# Altium footprint library surface.PcbLib: 97 footprints (part 5 of 7)
Each footprint in its own frame and in the unit in brackets; x right, y up, seen from the top. Pads: shape width x height; smd on the part's side, far side on the other; paste and mask are expansions set on the pad; w line width, h text height; cw(c..) or ccw(c..) is an arc to the next point about the centre after c.
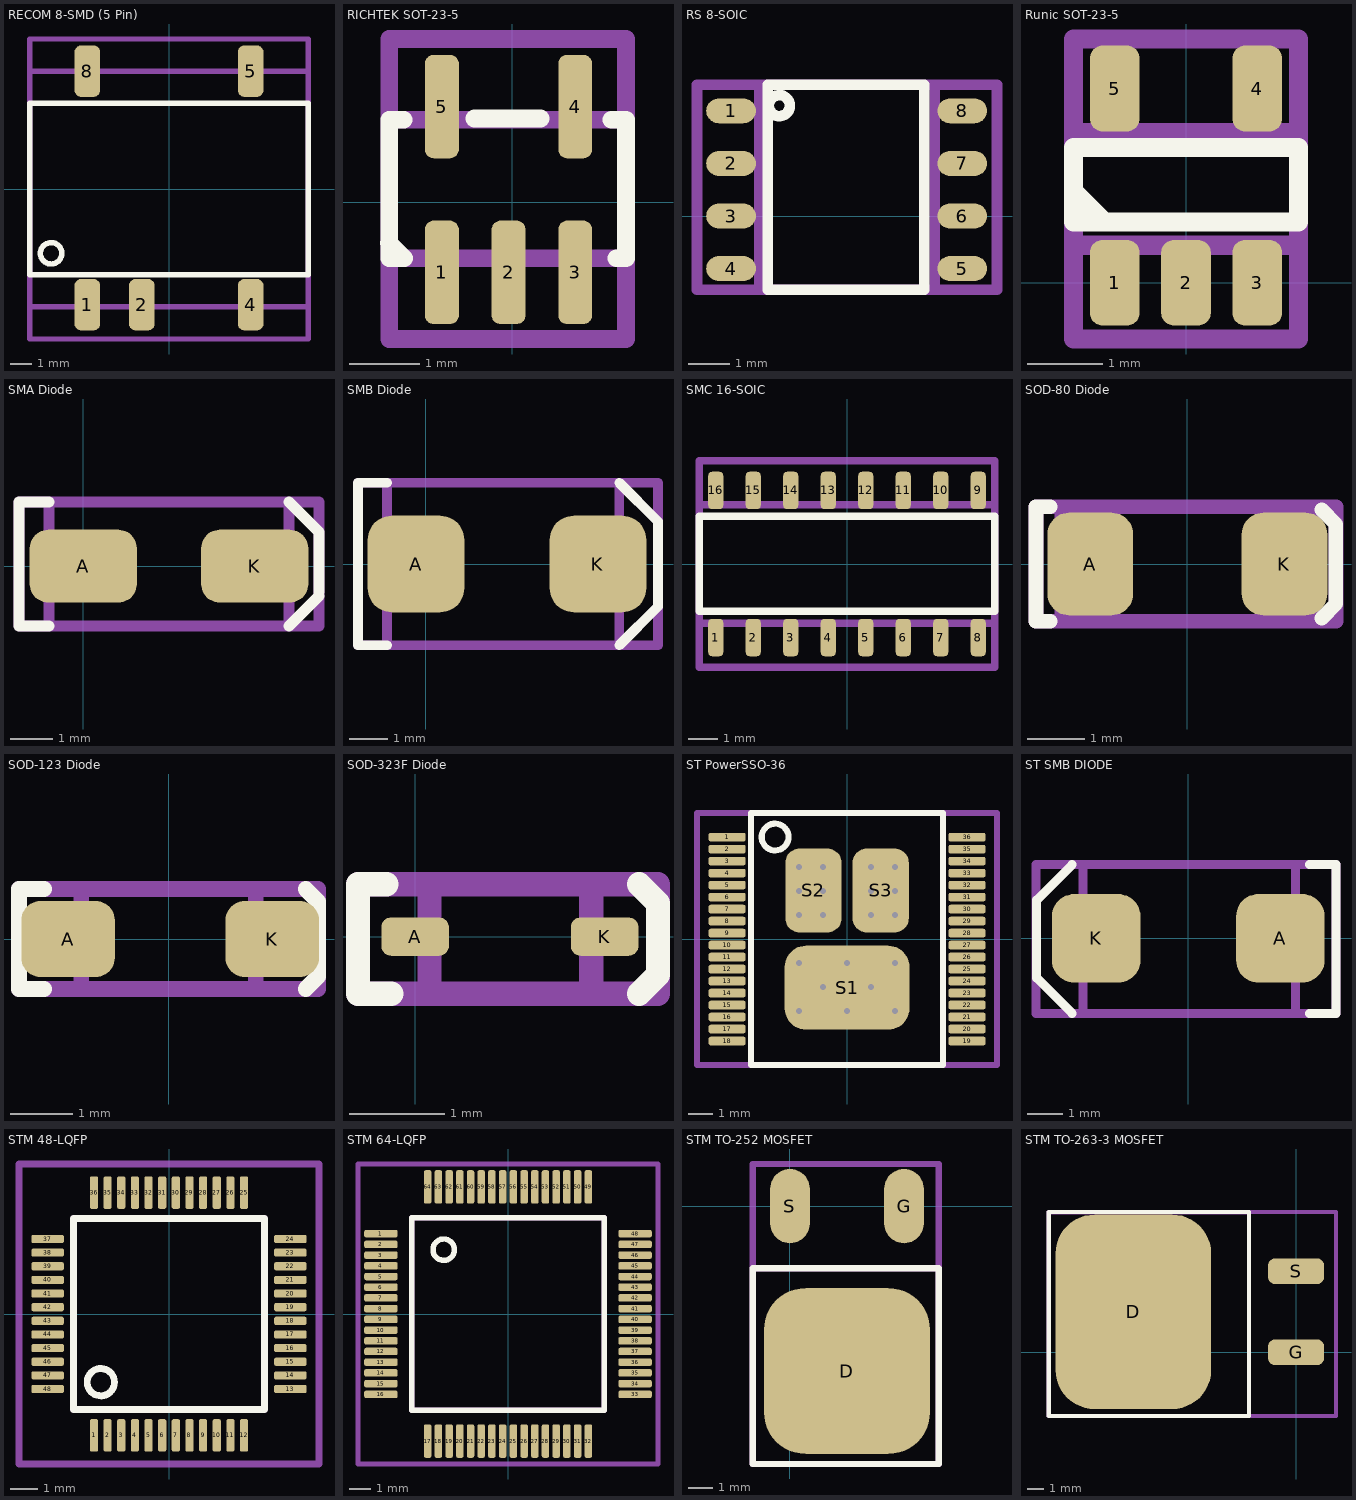
[diagram p4: the footprints below, top view; thin cyan lines are the x and y axes]

## RECOM 8-SMD (5 Pin) [mm]
pads (5):
  rrect50% 1.2x2.4 smd: 1(-3.81,-5.4) 2(-1.27,-5.4) 4(3.81,-5.4) 5(3.81,5.5) 8(-3.81,5.5)
Top Overlay:
  circle w0.254: c-5.5,-3 r0.5
  lines w0.254: -6.5,-4 6.5,-4 6.5,4 -6.5,4 -6.5,-4
Mechanical 13:
  lines w0.254: -6.5,-5.5 6.5,-5.5 6.5,5.5 -6.5,5.5 -6.5,-5.5
Mechanical 15:
  lines w0.254: -6.5,-7 -6.5,7 6.5,7 6.5,-7 -6.5,-7
3D body "R2S-2405-H--3DModel-STEP-1.STEP": height 9.2, standoff 0.2, extent -6.375,-5.55 6.375,5.55

## RICHTEK SOT-23-5 [mil]
pads (5):
  rrect50% 19x58 smd: 1(-39.37,-39.37) 2(-1.97,-39.37) 3(35.43,-39.37) 4(35.43,53.63) 5(-39.37,53.63)
Top Overlay:
  lines w10: -69,-23 -60.5,-31.5 ; -60.74,46.26 -68.9,46.26 -68.9,-31.5 -60.5,-31.5 ; -21,47 16,47 ; 55.74,46.26 63.98,46.26 63.98,-31.5 58.5,-31.5 ; -60.5,-31.5 -60.5,-31.5
Mechanical 13:
  lines w10: -68.9,-76.77 63.98,-76.77 63.98,91.54 -68.9,91.54 -68.9,-76.77
Mechanical 15:
  lines w10: -68.9,-31.5 -68.9,46.26 63.98,46.26 63.98,-31.5 -68.9,-31.5
3D body "DBV5.step": height 57.09, standoff 0, extent -61.97,-51.13 58.03,66.9

## RS 8-SOIC [mm]
pads (8):
  oval 1.2x0.6 smd: 1(-9.677,2.54) 2(-9.677,1.27) 3(-9.677,0) 4(-9.677,-1.27) 5(-4.089,-1.27) 6(-4.089,0) 7(-4.089,1.27) 8(-4.089,2.54)
Top Overlay:
  circle w0.254: c-8.509,2.667 r0.254
  lines w0.254: -8.788,-1.778 -5.004,-1.778 -5.004,3.175 -8.788,3.175 -8.788,-1.778
Mechanical 13:
  lines w0.254: -9,-1.778 -4.75,-1.778 -4.75,3.175 -8.255,3.175 -9,3.175 -9,-1.778
Mechanical 15:
  lines w0.254: -10.5,-1.778 -3.25,-1.778 -3.25,3.175 -10.5,3.175 -10.5,-1.778
3D body "D8.step": height 1.76, standoff 0, extent -9.957,-1.867 -3.759,3.137

## Runic SOT-23-5 [mil]
pads (5):
  rrect50% 26x45 smd: 1(-37.4,0) 2(0,0) 3(37.4,0) 4(37.4,101.97) 5(-37.4,101.97)
Top Overlay:
  lines w10: -59.06,49.21 -59.06,48.06 -44,33 ; -59.06,32 59.06,32 59.06,71 -59.06,71 -59.06,32
Mechanical 13:
  lines w10: -59.06,19.68 -59.06,78.74 59.06,78.74 59.06,19.68 -59.06,19.68
Mechanical 15:
  lines w10: -59.06,-29.53 -59.06,127.95 59.06,127.95 59.06,-29.53 -59.06,-29.53
3D body "DBV5.step": height 57.09, standoff 0, extent -60,-8.02 60,110.01

## SMA Diode [mm]
pads (2):
  rrect50% 2.5x1.7 smd: A(0,0) K(4,0)
Top Overlay:
  lines w0.254: -0.8,-1.4 -1.5,-1.4 -1.5,1.5 -0.8,1.5 ; 4.8,-1.4 5.5,-0.7 ; 4.8,1.5 5.5,0.8 5.5,-0.6
Mechanical 13:
  lines w0.254: -0.8,-1.4 -0.8,1.5 4.8,1.5 4.8,-1.4 -0.8,-1.4
Mechanical 15:
  lines w0.254: -1.5,-1.4 5.5,-1.4 5.5,1.5 -1.5,1.5 -1.5,-1.4
3D body "SMA.step": height 2.35, standoff 0, extent -0.795,-1.46 4.795,1.46

## SMB Diode [mm]
pads (2):
  rrect50% 2.5x2.5 smd: A(-0.25,0) K(4.45,0)
Top Overlay:
  lines w0.254: -1,-2.1 -1.75,-2.1 -1.75,2.1 -1,2.1 ; 5,-2.1 6,-1.1 6,1.1 5,2.1 ; 6,-1 6,0.7
Mechanical 13:
  lines w0.254: -1,-2.1 -1,2.1 5,2.1 5,-2.1 -1,-2.1
Mechanical 15:
  lines w0.254: -1.75,-2.1 -1.75,2.1 6,2.1 6,-2.1 -1.75,-2.1
3D body "SMB.STEP": height 2.5, standoff 0, extent -0.695,-1.97 4.895,1.97

## SMC 16-SOIC [mm]
pads (16):
  rrect50% 0.51x1.27 smd: 1(-4.445,-2.49) 2(-3.175,-2.49) 3(-1.905,-2.49) 4(-0.635,-2.49) 5(0.635,-2.49) 6(1.905,-2.49) 7(3.175,-2.49) 8(4.445,-2.49) 9(4.445,2.49) 10(3.175,2.49) 11(1.905,2.49) 12(0.635,2.49) 13(-0.635,2.49) 14(-1.905,2.49) 15(-3.175,2.49) 16(-4.445,2.49)
Top Overlay:
  lines w0.254: -5,-1.6 5,-1.6 5,1.626 -5,1.626 -5,-1.6
Mechanical 13:
  lines w0.254: -5,-2 5,-2 5,2 -5,2 -5,-2
Mechanical 15:
  lines w0.254: -5,-3.5 5,-3.5 5,3.5 -5,3.5 -5,-3.5
3D body: height 1.5, standoff 0, extent -5,-2 5,2

## SOD-80 Diode [mm]
pads (2):
  rrect50% 1.5x1.8 smd: A(-1.7,0) K(1.7,0)
Top Overlay:
  lines w0.254: -2.4,-1 -2.65,-1 -2.65,1 -2.4,1 ; 2.35,-0.95 2.6,-0.7 2.6,0.7 2.35,0.95
Mechanical 13:
  lines w0.254: -2.2,-1 2.2,-1 2.2,1 -2.2,1 -2.2,-1
Mechanical 15:
  lines w0.254: -2.65,-1 -2.65,1 2.602,1 2.602,-1 -2.65,-1
3D body "SOD-80C.STEP": height 1.6, standoff 0, extent -1.85,-0.803 1.85,0.804

## SOD-123 Diode [mil]
pads (2):
  rrect50% 59.06x48 smd: A(-63.5,0) K(65.5,0)
Top Overlay:
  lines w10: -78.74,-31.5 -94.49,-31.5 -94.49,31.5 -78.74,31.5 ; 86.61,-31.5 94.49,-23.62 ; 86.61,31.5 94.49,23.62 ; 94.49,-23.62 94.49,-23.62 ; 94.49,-23.62 94.49,23.62 ; 94.49,23.62 94.49,23.62
Mechanical 13:
  lines w10: -55.12,-31.5 55.12,-31.5 55.12,31.5 -55.12,31.5 -55.12,-31.5
Mechanical 15:
  lines w10: -94.49,-31.5 94.49,-31.5 94.49,31.5 55.12,31.5 -94.49,31.5 -94.49,-31.5
3D body "sod123 v4.step": height 47.24, standoff 0, extent -72.82,-33.47 74.82,33.46

## SOD-323F Diode [mm]
pads (2):
  rrect50% 0.71x0.403 smd: A(0,0) K(1.99,0)
Top Overlay:
  lines w0.254: -0.3,0.55 -0.6,0.55 -0.6,-0.6 -0.25,-0.6 ; 2.35,-0.6 2.55,-0.4 2.55,0.35 2.35,0.55
Mechanical 13:
  lines w0.254: 0.15,-0.6 1.85,-0.6 1.85,0.55 0.15,0.55 0.15,-0.6
Mechanical 15:
  lines w0.254: -0.6,-0.6 -0.6,0.55 -0.25,0.55 2.55,0.55 2.55,-0.6 -0.25,-0.6 -0.6,-0.6
3D body "BAS21J_115.step": height 0.8, standoff 0, extent -0.25,-0.675 2.25,0.675

## ST PowerSSO-36 [mm]
pads (39):
  rrect50% 1.55x0.36 smd: 1(-5,4.25) 2(-5,3.75) 3(-5,3.25) 4(-5,2.75) 5(-5,2.25) 6(-5,1.75) 7(-5,1.25) 8(-5,0.75) 9(-5,0.25) 10(-5,-0.25) 11(-5,-0.75) 12(-5,-1.25) 13(-5,-1.75) 14(-5,-2.25) 15(-5,-2.75) 16(-5,-3.25) 17(-5,-3.75) 18(-5,-4.25) 19(5,-4.25) 20(5,-3.75) 21(5,-3.25) 22(5,-2.75) 23(5,-2.25) 24(5,-1.75) 25(5,-1.25) 26(5,-0.75) 27(5,-0.25) 28(5,0.25) 29(5,0.75) 30(5,1.25) 31(5,1.75) 32(5,2.25) 33(5,2.75) 34(5,3.25) 35(5,3.75) 36(5,4.25)
  rrect50% 5.2x3.5 smd: S1(0,-2.025)
  rrect50% 2.35x3.5 smd: S2(-1.4,2.025) S3(1.4,2.025)
via -2,3 diameter 0.55 hole 0.25
via -2,2 diameter 0.55 hole 0.25
via -2,1 diameter 0.55 hole 0.25
via -1,1 diameter 0.55 hole 0.25
via -1,2 diameter 0.55 hole 0.25
via -1,3 diameter 0.55 hole 0.25
via 1,3 diameter 0.55 hole 0.25
via 2,3 diameter 0.55 hole 0.25
via 2,2 diameter 0.55 hole 0.25
via 1,2 diameter 0.55 hole 0.25
via 1,1 diameter 0.55 hole 0.25
via 2,1 diameter 0.55 hole 0.25
via -2,-1 diameter 0.55 hole 0.25
via 0,-1 diameter 0.55 hole 0.25
via 2,-1 diameter 0.55 hole 0.25
via 2,-3 diameter 0.55 hole 0.25
via 0,-3 diameter 0.55 hole 0.25
via -2,-3 diameter 0.55 hole 0.25
via -1,-2 diameter 0.55 hole 0.25
via 1,-2 diameter 0.55 hole 0.25
Top Overlay:
  circle w0.254: c-3,4.25 r0.559
  lines w0.254: -4,-5.25 4,-5.25 4,5.25 -4,5.25 -4,-5.25
Mechanical 13:
  lines w0.254: -4,-5.245 4,-5.245 4,5.25 -4,5.25 -4,-5.245
Mechanical 15:
  lines w0.254: -6.255,-5.245 -6.255,5.255 -6.25,5.25 6.25,5.25 6.25,-5.25 6.245,-5.245 -6.255,-5.245
3D body "PowerSSO-36.STEP": height 2.33, standoff 0, extent -5.169,-5.15 5.169,5.15

## ST SMB DIODE [mm]
pads (2):
  rrect50% 2.5x2.5 smd: A(2.6,0) K(-2.6,0)
Top Overlay:
  lines w0.254: -4.28,-0.72 -4.28,0.98 ; -3.28,-2.12 -4.28,-1.12 -4.28,1.08 -3.28,2.08 ; 3.42,-2.12 4.17,-2.12 4.17,2.08 3.42,2.08
Mechanical 13:
  lines w0.254: -2.98,-2.12 3.02,-2.12 3.02,2.08 -2.98,2.08 -2.98,-2.12
Mechanical 15:
  lines w0.254: -4.3,-2.12 4.17,-2.12 4.17,2.08 -4.3,2.08 -4.3,-2.12
3D body "SMB.STEP": height 2.5, standoff 0, extent -2.875,-1.99 2.715,1.95

## STM 48-LQFP [mm]
pads (48):
  rrect50% 0.3x1.2 smd mask+0.05: 1(-2.75,-4.45) 2(-2.25,-4.45) 3(-1.75,-4.45) 4(-1.25,-4.45) 5(-0.75,-4.45) 6(-0.25,-4.45) 7(0.25,-4.45) 8(0.75,-4.45) 9(1.25,-4.45) 10(1.75,-4.45) 11(2.25,-4.45) 12(2.75,-4.45) 25(2.75,4.45) 26(2.25,4.45) 27(1.75,4.45) 28(1.25,4.45) 29(0.75,4.45) 30(0.25,4.45) 31(-0.25,4.45) 32(-0.75,4.45) 33(-1.25,4.45) 34(-1.75,4.45) 35(-2.25,4.45) 36(-2.75,4.45)
  rrect50% 1.2x0.3 smd mask+0.05: 13(4.45,-2.75) 14(4.45,-2.25) 15(4.45,-1.75) 16(4.45,-1.25) 17(4.45,-0.75) 18(4.45,-0.25) 19(4.45,0.25) 20(4.45,0.75) 21(4.45,1.25) 22(4.45,1.75) 23(4.45,2.25) 24(4.45,2.75) 37(-4.45,2.75) 38(-4.45,2.25) 39(-4.45,1.75) 40(-4.45,1.25) 41(-4.45,0.75) 42(-4.45,0.25) 43(-4.45,-0.25) 44(-4.45,-0.75) 45(-4.45,-1.25) 46(-4.45,-1.75) 47(-4.45,-2.25) 48(-4.45,-2.75)
Top Overlay:
  circle w0.254: c-2.5,-2.5 r0.5
  lines w0.254: -3.5,-3.5 3.5,-3.5 3.5,3.5 -3.5,3.5 -3.5,-3.5
Mechanical 13:
  lines w0.254: -3.5,-3.5 -3.5,3.5 3.5,3.5 3.5,-3.5 -3.5,-3.5
Mechanical 15:
  lines w0.254: -5.5,-5.5 -5.5,5.5 5.5,5.5 5.5,-5.5 -5.5,-5.5
3D body "LQFP-48-L.step": height 1.6, standoff 0, extent -4.597,-4.597 4.597,4.597

## STM 64-LQFP [mm]
pads (64):
  rrect50% 1.56x0.35 smd mask+0.05: 1(-5.93,3.75) 2(-5.93,3.25) 3(-5.93,2.75) 4(-5.93,2.25) 5(-5.93,1.75) 6(-5.93,1.25) 7(-5.93,0.75) 8(-5.93,0.25) 9(-5.93,-0.25) 10(-5.93,-0.75) 11(-5.93,-1.25) 12(-5.93,-1.75) 13(-5.93,-2.25) 14(-5.93,-2.75) 15(-5.93,-3.25) 16(-5.93,-3.75) 33(5.93,-3.75) 34(5.93,-3.25) 35(5.93,-2.75) 36(5.93,-2.25) 37(5.93,-1.75) 38(5.93,-1.25) 39(5.93,-0.75) 40(5.93,-0.25) 41(5.93,0.25) 42(5.93,0.75) 43(5.93,1.25) 44(5.93,1.75) 45(5.93,2.25) 46(5.93,2.75) 47(5.93,3.25) 48(5.93,3.75)
  rrect50% 0.35x1.56 smd mask+0.05: 17(-3.75,-5.93) 18(-3.25,-5.93) 19(-2.75,-5.93) 20(-2.25,-5.93) 21(-1.75,-5.93) 22(-1.25,-5.93) 23(-0.75,-5.93) 24(-0.25,-5.93) 25(0.25,-5.93) 26(0.75,-5.93) 27(1.25,-5.93) 28(1.75,-5.93) 29(2.25,-5.93) 30(2.75,-5.93) 31(3.25,-5.93) 32(3.75,-5.93) 49(3.75,5.93) 50(3.25,5.93) 51(2.75,5.93) 52(2.25,5.93) 53(1.75,5.93) 54(1.25,5.93) 55(0.75,5.93) 56(0.25,5.93) 57(-0.25,5.93) 58(-0.75,5.93) 59(-1.25,5.93) 60(-1.75,5.93) 61(-2.25,5.93) 62(-2.75,5.93) 63(-3.25,5.93) 64(-3.75,5.93)
Top Overlay:
  circle w0.254: c-3,3 r0.5
  lines w0.254: -4.5,-4.5 4.5,-4.5 4.5,4.5 -4.5,4.5 -4.5,-4.5
Mechanical 13:
  lines w0.254: -4.5,-4.5 4.5,-4.5 4.5,4.5 -4.5,4.5 -4.5,-4.5
Mechanical 15:
  lines w0.254: -7,-7 7,-7 7,7 6.5,7 -7,7 -7,-7
3D body "STM32F446RET6--3DModel-STEP-56544.STEP": height 1.63, standoff 0.03, extent -6,-6 6,6

## STM TO-252 MOSFET [mm]
pads (3):
  rrect50% 6.7x6.7 smd: D(2.3,-6.65)
  oval 1.6x3 smd: G(4.6,0) S(0,0)
Top Overlay:
  lines w0.254: -1.5,-10.4 -1.5,-2.5 6,-2.5 6,-10.4 -1.5,-10.4
Mechanical 13:
  lines w0.254: -1.5,-10.4 -1.5,-2.5 6,-2.5 6,-10.4 -1.5,-10.4
Mechanical 15:
  lines w0.254: -1.5,-10.4 -1.5,1.7 6,1.7 6,-10.4 -1.5,-10.4
3D body "TO-252AA-IRF.stp": height 2.39, standoff 0, extent -1.076,-9.667 5.636,0.747

## STM TO-263-3 MOSFET [mm]
pads (3):
  rrect50% 9.75x12.2 smd: D(-10.2,2.54)
  rrect50% 3.5x1.6 smd: G(0,0) S(0,5.08)
Top Overlay:
  lines w0.254: -15.5,-4 -15.5,8.8 -2.95,8.8 -2.95,-4 -15.5,-4
Mechanical 13:
  lines w0.254: -15.5,-4 -15.5,8.8 2.5,8.8 2.5,-4 -15.5,-4
Mechanical 15:
  lines w0.254: -15.5,-4 -15.5,8.75 -3,8.75 -2.95,8.8 -2.95,-4 -15.5,-4
3D body "TO-263AB.stp": height 4.8, standoff 0, extent -14.4,-2.831 1.45,7.812